# Altium footprint library GCT_USB-C.PcbLib: 27 footprints (part 2 of 2)
Each footprint in its own frame and in the unit in brackets; x right, y up, seen from the top. Pads: shape width x height; smd on the part's side, far side on the other; paste and mask are expansions set on the pad; w line width, h text height; cw(c..) or ccw(c..) is an arc to the next point about the centre after c.
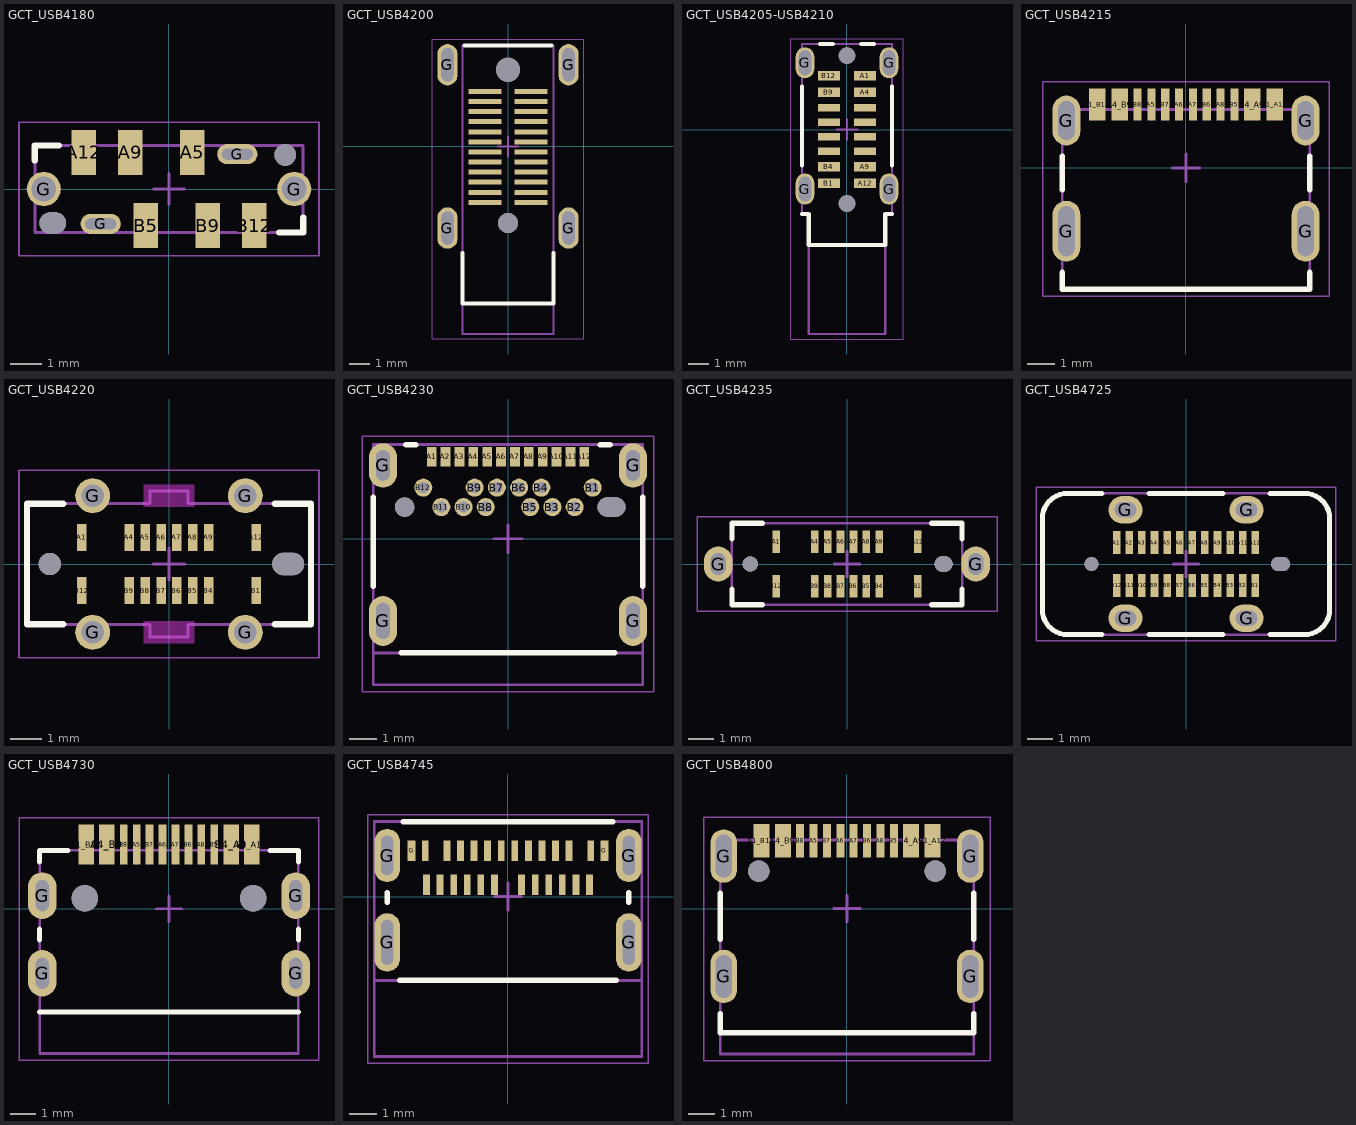
[diagram p1: the footprints below, top view; thin cyan lines are the x and y axes]

## GCT_USB4180 [mm]
height 11.16
pads (12):
  rect 0.8x1.46 smd mask+0.07: A5(0.75,1.18) A9(-1.25,1.18) A12(-2.75,1.18) B5(-0.75,-1.18) B9(1.25,-1.18) B12(2.75,-1.18)
  round 1.1 hole 0.8 mask+0.07: G(-4.04,0) G(4.04,0)
  oval 1.3x0.65 hole 0.35 slot 1 at 0 deg mask+0.07: G(-2.205,-1.125) G(2.205,1.125)
  oval 0.85x0.7 hole 0.7 slot 0.85 at 0 deg unplated mask+0.07: ""(-3.75,-1.1)
  round 0.7 hole 0.7 unplated mask+0.07: ""(3.75,1.1)
Top Overlay:
  lines w0.2: -4.33,0.92 -4.33,1.4 -3.55,1.4 ; 3.55,-1.4 4.33,-1.4 4.33,-0.92
Top Assembly:
  lines w0.1: -4.33,-1.4 4.33,-1.4 4.33,1.4 -4.33,1.4 -4.33,-1.4
  text ".Designator" at -2.252,-0.226 h1
Top Courtyard:
  lines w0.05: -4.84,-2.16 4.84,-2.16 4.84,2.16 -4.84,2.16 -4.84,-2.16
  lines w0.1: -0.5,0 0.5,0 ; 0,-0.5 0,0.5
3D body "usb4180-03-0120-c.stp": height 11.16, standoff -1.14, extent -4.33,-1.7 4.33,1.7

## GCT_USB4200 [mm]
height 10.13
pads (30):
  rect 1.625x0.25 smd mask+0.07: A1(1.138,2.725) A2(1.138,2.225) A3(1.138,1.725) A4(1.138,1.225) A5(1.138,0.725) A6(1.138,0.225) A7(1.138,-0.275) A8(1.138,-0.775) A9(1.138,-1.275) A10(1.138,-1.775) A11(1.138,-2.275) A12(1.138,-2.775) B1(-1.138,-2.775) B2(-1.138,-2.275) B3(-1.138,-1.775) B4(-1.138,-1.275) B5(-1.138,-0.775) B6(-1.138,-0.275) B7(-1.138,0.225) B8(-1.138,0.725) B9(-1.138,1.225) B10(-1.138,1.725) B11(-1.138,2.225) B12(-1.138,2.725)
  oval 1x2.05 hole 0.6 slot 1.65 at 90 deg mask+0.07: G(-3,-4.05) G(-3,4.05) G(3,-4.05) G(3,4.05)
  round 1 hole 1 unplated mask+0.07: ""(0,-3.8)
  round 1.2 hole 1.2 unplated mask+0.07: ""(0,3.8)
Top Overlay:
  lines w0.2: -2.26,-5.293 -2.26,-7.8 2.26,-7.8 2.26,-5.293 ; -2.165,5 2.165,5
Top Assembly:
  lines w0.1: -2.26,-7.8 -2.26,5 2.26,5 2.26,-7.8 -2.26,-7.8
  text ".Designator" at -0.226,2.252 h1
Top Courtyard:
  lines w0.05: -3.75,-9.55 -3.75,5.325 3.75,5.325 3.75,-9.55 -3.75,-9.55
  lines w0.1: -0.5,0 0.5,0 ; 0,-0.5 0,0.5
Assembly Notes:
  lines w0.1: -2.26,-9.3 -2.26,-7.8 2.26,-7.8 2.26,-9.3 -2.26,-9.3
  text "PCB Edge" at -0.034,-7.618 h0.51
3D body "usb4200-03-a.stp": height 9.8, standoff -1.73, extent -3.15,-9.33 3.15,4.97

## GCT_USB4205-USB4210 [mm]
height 12.5
pads (22):
  rect 1.05x0.45 smd mask+0.07: A1(0.875,2.605) A4(0.875,1.805) A9(0.875,-1.795) A12(0.875,-2.595) B1(-0.875,-2.595) B4(-0.875,-1.795) B9(-0.875,1.805) B12(-0.875,2.605)
  rect 1.05x0.35 smd mask+0.07: A5(0.875,1.055) A6(0.875,0.355) A7(0.875,-0.345) A8(0.875,-1.045) B5(-0.875,-1.045) B6(-0.875,-0.345) B7(-0.875,0.355) B8(-0.875,1.055)
  oval 0.9x1.5 hole 0.6 slot 1.2 at 90 deg mask+0.07: G(-2.03,-2.875) G(-2.03,3.225) G(2.03,-2.875) G(2.03,3.225)
  round 0.8 hole 0.8 unplated mask+0.07: ""(0,-3.575) ""(0,3.575)
Top Overlay:
  lines w0.2: -2.18,-4.075 -1.85,-4.075 -1.85,-5.575 1.85,-5.575 1.85,-4.075 2.18,-4.075 ; -2.18,-1.734 -2.18,2.084 ; -1.307,4.125 -0.691,4.125 ; 0.691,4.125 1.307,4.125 ; 2.18,-1.734 2.18,2.084
Top Assembly:
  lines w0.1: -2.18,-4.075 -1.85,-4.075 -1.85,-5.575 1.85,-5.575 1.85,-4.075 2.18,-4.075 2.18,4.125 -2.18,4.125 -2.18,-4.075
  text ".Designator" at -0.226,2.252 h1
Top Courtyard:
  lines w0.05: -2.73,-10.125 2.73,-10.125 2.73,4.375 -2.73,4.375 -2.73,-10.125
  lines w0.1: -0.5,0 0.5,0 ; 0,-0.5 0,0.5
Assembly Notes:
  lines w0.1: -1.85,-9.875 -1.85,-5.575 1.85,-5.575 1.85,-9.875 -1.85,-9.875
  text "PCB Edge" at -0.334,-5.393 h0.51
3D body "usb4205-gf-a.stp": height 12.51, standoff -1.49, extent -2.18,-9.87 2.18,4.14

## GCT_USB4215 [mm]
height 3.16
pads (16):
  rect 0.6x1.15 smd mask+0.07: A1_B12(-3.2,2.288) A4_B9(-2.4,2.288) B1_A12(3.2,2.288) B4_A9(2.4,2.288)
  rect 0.3x1.15 smd mask+0.07: A5(-1.25,2.288) A6(-0.25,2.288) A7(0.25,2.288) A8(1.25,2.288) B5(1.75,2.288) B6(0.75,2.288) B7(-0.75,2.288) B8(-1.75,2.288)
  oval 1x2.2 hole 0.6 slot 1.8 at 90 deg mask+0.07: G(-4.32,-2.287) G(4.32,-2.287)
  oval 1x1.8 hole 0.6 slot 1.4 at 90 deg mask+0.07: G(-4.32,1.713) G(4.32,1.713)
Top Overlay:
  lines w0.2: -4.47,-3.779 -4.47,-4.387 4.47,-4.387 4.47,-3.779 ; -4.47,-0.795 -4.47,0.421 ; 4.47,-0.795 4.47,0.421
Top Assembly:
  lines w0.1: -4.47,-4.387 -4.47,2.113 4.47,2.113 4.47,-4.387 -4.47,-4.387
  text ".Designator" at -2.252,-0.226 h1
  text "PCB Edge" at 2.216,-4.155 h0.51
Top Courtyard:
  lines w0.05: -5.17,-4.637 -5.17,3.113 5.17,3.113 5.17,-4.637 -5.17,-4.637
  lines w0.1: -0.5,0 0.5,0 ; 0,-0.5 0,0.5
3D body "usb4215-03-a.stp": height 3.26, standoff -0.8, extent -4.47,-4.35 4.47,2.399

## GCT_USB4220 [mm]
height 10.4
pads (22):
  rect 0.3x0.85 smd mask+0.07: A1(-2.75,0.835) A4(-1.25,0.835) A5(-0.75,0.835) A6(-0.25,0.835) A7(0.25,0.835) A8(0.75,0.835) A9(1.25,0.835) A12(2.75,0.835) B1(2.75,-0.835) B4(1.25,-0.835) B5(0.75,-0.835) B6(0.25,-0.835) B7(-0.25,-0.835) B8(-0.75,-0.835) B9(-1.25,-0.835) B12(-2.75,-0.835)
  round 1.1 hole 0.7 mask+0.07: G(-2.4,-2.15) G(-2.4,2.15) G(2.4,-2.15) G(2.4,2.15)
  round 0.7 hole 0.7 unplated mask+0.07: ""(-3.75,0)
  oval 1x0.7 hole 0.7 slot 1 at 0 deg unplated mask+0.07: ""(3.75,0)
Top Layer keep-out:
  region: 0.8,1.8 -0.8,1.8 -0.8,2.5 0.8,2.5
  region: 0.8,-2.5 -0.8,-2.5 -0.8,-1.8 0.8,-1.8
Top Overlay:
  lines w0.2: -3.328,-1.9 -4.47,-1.9 -4.47,1.9 -3.328,1.9 ; 3.328,-1.9 4.47,-1.9 4.47,1.9 3.328,1.9
Top Assembly:
  lines w0.1: -4.47,-1.9 -4.47,1.9 -0.6,1.9 -0.6,2.3 0.6,2.3 0.6,1.9 4.47,1.9 4.47,-1.9 0.6,-1.9 0.6,-2.3 -0.6,-2.3 -0.6,-1.9 -4.47,-1.9
  text ".Designator" at -2.252,-0.226 h1
Top Courtyard:
  lines w0.05: -4.72,-2.95 4.72,-2.95 4.72,2.95 -4.72,2.95 -4.72,-2.95
  lines w0.1: -0.5,0 0.5,0 ; 0,-0.5 0,0.5
3D body "usb4220-03-0880-c.stp": height 8.8, standoff -1.1, extent -4.47,-2.3 4.47,2.3

## GCT_USB4230 [mm]
height 3.46
pads (30):
  rect 0.35x0.7 smd mask+0.05: A1(-2.75,2.955) A2(-2.25,2.955) A3(-1.75,2.955) A4(-1.25,2.955) A5(-0.75,2.955) A6(-0.25,2.955) A7(0.25,2.955) A8(0.75,2.955) A9(1.25,2.955) A10(1.75,2.955) A11(2.25,2.955) A12(2.75,2.955)
  round 0.65 hole 0.4 mask+0.05: B1(3.05,1.845) B2(2.4,1.145) B3(1.6,1.145) B4(1.2,1.845) B5(0.8,1.145) B6(0.4,1.845) B7(-0.4,1.845) B8(-0.8,1.145) B9(-1.2,1.845) B10(-1.6,1.145) B11(-2.4,1.145) B12(-3.05,1.845)
  oval 1x1.8 hole 0.5 slot 1.3 at 90 deg mask+0.05: G(-4.5,-2.955) G(4.5,-2.955)
  oval 1x1.6 hole 0.5 slot 1.1 at 90 deg mask+0.05: G(-4.5,2.645) G(4.5,2.645)
  round 0.7 hole 0.7 unplated mask+0.05: ""(-3.725,1.145)
  oval 1x0.7 hole 0.7 slot 1 at 0 deg unplated mask+0.05: ""(3.725,1.145)
Top Overlay:
  lines w0.2: -4.85,-1.7 -4.85,1.49 ; -3.84,-4.105 3.84,-4.105 ; -3.673,3.395 -3.323,3.395 ; 3.323,3.395 3.673,3.395 ; 4.85,-1.7 4.85,1.49
Top Assembly:
  lines w0.1: -4.85,-4.105 -4.85,3.395 4.85,3.395 4.85,-4.105 -4.85,-4.105
  text ".Designator" at -2.252,-0.226 h1
Top Courtyard:
  lines w0.05: -5.25,-5.505 -5.25,3.695 5.25,3.695 5.25,-5.505 -5.25,-5.505
  lines w0.1: -0.5,0 0.5,0 ; 0,-0.5 0,0.5
Assembly Notes:
  lines w0.1: 4.836,-4.105 -4.85,-4.105 -4.85,-5.255 4.85,-5.255 ; 4.851,-5.254 4.851,-4.089
  text "PCB Edge" at 1.766,-3.948 h0.51
3D body "usb4230-03-a.stp": height 3.46, standoff -1.6, extent -4.88,-5.25 4.88,3.4

## GCT_USB4235 [mm]
height 6.5
pads (20):
  rect 0.3x0.87 smd mask+0.07: A1(-2.75,0.865) A4(-1.25,0.865) A5(-0.75,0.865) A6(-0.25,0.865) A7(0.25,0.865) A8(0.75,0.865) A9(1.25,0.865) A12(2.75,0.865) B1(2.75,-0.865) B4(1.25,-0.865) B5(0.75,-0.865) B6(0.25,-0.865) B7(-0.25,-0.865) B8(-0.75,-0.865) B9(-1.25,-0.865) B12(-2.75,-0.865)
  oval 1.1x1.35 hole 0.6 slot 0.85 at 90 deg mask+0.07: G(-5,0) G(5,0)
  round 0.6 hole 0.6 unplated mask+0.07: ""(-3.75,0)
  oval 0.7x0.6 hole 0.6 slot 0.7 at 0 deg unplated mask+0.07: ""(3.75,0)
Top Overlay:
  lines w0.2: -4.47,-0.977 -4.47,-1.58 -3.281,-1.58 ; -4.47,0.977 -4.47,1.58 -3.281,1.58 ; 3.281,-1.58 4.47,-1.58 4.47,-0.977 ; 3.281,1.58 4.47,1.58 4.47,0.977
Top Assembly:
  lines w0.1: -4.47,-1.58 -4.47,1.58 4.47,1.58 4.47,-1.58 -4.47,-1.58
  text ".Designator" at -2.252,-0.226 h1
Top Courtyard:
  lines w0.05: -5.825,-1.83 -5.825,1.83 5.825,1.83 5.825,-1.83 -5.825,-1.83
  lines w0.1: -0.5,0 0.5,0 ; 0,-0.5 0,0.5
3D body "usb4235-03-c.stp": height 6.5, standoff -0.95, extent -5.15,-1.6 5.15,1.6

## GCT_USB4725 [mm]
height 6.7
pads (30):
  rect 0.3x0.9 smd mask+0.07: A1(-2.75,0.85) A2(-2.25,0.85) A3(-1.75,0.85) A4(-1.25,0.85) A5(-0.75,0.85) A6(-0.25,0.85) A7(0.25,0.85) A8(0.75,0.85) A9(1.25,0.85) A10(1.75,0.85) A11(2.25,0.85) A12(2.75,0.85) B1(2.75,-0.85) B2(2.25,-0.85) B3(1.75,-0.85) B4(1.25,-0.85) B5(0.75,-0.85) B6(0.25,-0.85) B7(-0.25,-0.85) B8(-0.75,-0.85) B9(-1.25,-0.85) B10(-1.75,-0.85) B11(-2.25,-0.85) B12(-2.75,-0.85)
  oval 1.35x1.1 hole 0.6 slot 0.85 at 0 deg mask+0.07: G(-2.4,-2.15) G(-2.4,2.15) G(2.4,-2.15) G(2.4,2.15)
  round 0.55 hole 0.55 unplated mask+0.07: ""(-3.75,0)
  oval 0.75x0.55 hole 0.55 slot 0.75 at 0 deg unplated mask+0.07: ""(3.75,0)
Top Overlay:
  lines w0.2: -3.331,-2.8 -4.7,-2.8 cw(c-4.7,-1.8) -5.7,-1.8 -5.7,1.8 cw(c-4.7,1.8) -4.7,2.8 -3.331,2.8 ; -1.469,-2.8 1.469,-2.8 ; -1.469,2.8 1.469,2.8 ; 3.331,-2.8 4.7,-2.8 ccw(c4.7,-1.8) 5.7,-1.8 5.7,1.8 ccw(c4.7,1.8) 4.7,2.8 3.331,2.8
Top Assembly:
  lines w0.1: -5.7,-1.8 ccw(c-4.7,-1.8) -4.7,-2.8 ; -5.7,-1.8 ccw(c-4.7,-1.8) -4.7,-2.8 ; -5.7,-1.8 -5.7,1.8 ; -5.7,1.8 cw(c-4.7,1.8) -4.7,2.8 ; -5.7,1.8 cw(c-4.7,1.8) -4.7,2.8 ; -4.7,-2.8 4.7,-2.8 ; -4.7,2.8 4.7,2.8 ; 4.7,-2.8 ccw(c4.7,-1.8) 5.7,-1.8 ; 4.7,-2.8 ccw(c4.7,-1.8) 5.7,-1.8 ; 4.7,2.8 cw(c4.7,1.8) 5.7,1.8 ; 4.7,2.8 cw(c4.7,1.8) 5.7,1.8 ; 5.7,-1.8 5.7,1.8
  text ".Designator" at -2.252,-0.226 h1
Top Courtyard:
  lines w0.05: -5.95,-3.05 -5.95,3.05 5.95,3.05 5.95,-3.05 -5.95,-3.05
  lines w0.1: -0.5,0 0.5,0 ; 0,-0.5 0,0.5
3D body "usb4725-03-c.stp": height 6.55, standoff -0.85, extent -5.7,-2.8 5.7,2.8

## GCT_USB4730 [mm]
height 4.66
pads (18):
  rect 0.6x1.55 smd mask+0.05: A1_B12(-3.2,2.488) A4_B9(-2.4,2.488) B1_A12(3.2,2.488) B4_A9(2.4,2.488)
  rect 0.3x1.55 smd mask+0.05: A5(-1.25,2.488) A6(-0.25,2.488) A7(0.25,2.488) A8(1.25,2.488) B5(1.75,2.488) B6(0.75,2.488) B7(-0.75,2.488) B8(-1.75,2.488)
  rrect100% 1.1x1.8 hole 0.5 slot 1.2 at 90 deg mask+0.07: G(-4.895,-2.487) G(4.895,-2.487)
  oval 1.1x1.8 hole 0.5 slot 1.2 at 90 deg mask+0.07: G(-4.895,0.513) G(4.895,0.513)
  round 1.02 hole 1.02 unplated mask+0.07: ""(-3.25,0.413) ""(3.25,0.413)
Top Overlay:
  lines w0.2: -5,-3.987 5,-3.987 ; -5,-1.191 -5,-0.783 ; -5,1.809 -5,2.263 -3.9,2.263 ; 3.9,2.263 5,2.263 5,1.809 ; 5,-1.191 5,-0.783
Top Assembly:
  lines w0.1: -5,-3.987 5,-3.987 ; -5,-3.987 -5,2.263 5,2.263 5,-3.987
  text ".Designator" at -2.252,-0.226 h1
Top Courtyard:
  lines w0.05: -5.795,-5.837 -5.795,3.513 5.795,3.513 5.795,-5.837 -5.795,-5.837
  lines w0.1: -0.5,0 0.5,0 ; 0,-0.5 0,0.5
Assembly Notes:
  lines w0.1: -5,-3.987 -5,-5.587 5,-5.587 5,-3.987 -4.999,-3.987
  text "PCB Edge" at 2.766,-3.805 h0.51
3D body "step_temp.STEP": height 4.66, standoff -0.65, extent -5.03,-5.6 4.97,2.755

## GCT_USB4745 [mm]
height 4.21
pads (30):
  rect 0.25x0.75 smd mask+0.07: A1(-3.05,1.687) A2(-2.25,1.687) A3(-1.75,1.687) A4(-1.25,1.687) A5(-0.75,1.687) A6(-0.25,1.687) A7(0.25,1.687) A8(0.75,1.687) A9(1.25,1.687) A10(1.75,1.687) A11(2.25,1.687) A12(3.05,1.687) B1(3,0.437) B2(2.5,0.437) B3(2,0.437) B4(1.5,0.437) B5(1,0.437) B6(0.5,0.437) B7(-0.5,0.437) B8(-1,0.437) B9(-1.5,0.437) B10(-2,0.437) B11(-2.5,0.437) B12(-3,0.437)
  oval 0.95x2.15 hole 0.45 slot 1.65 at 90 deg mask+0.07: G(-4.45,-1.687) G(4.45,-1.687)
  oval 0.95x1.95 hole 0.45 slot 1.45 at 90 deg mask+0.07: G(-4.45,1.513) G(4.45,1.513)
  rect 0.3x0.75 smd mask+0.07: G(-3.55,1.687) G(3.55,1.687)
Top Overlay:
  lines w0.2: -4.45,-0.212 -4.45,0.138 ; -3.995,-3.087 3.995,-3.087 ; -3.853,2.763 3.853,2.763 ; 4.45,-0.212 4.45,0.138
Top Assembly:
  lines w0.1: -4.925,-3.087 -4.925,2.763 4.925,2.763 4.925,-3.087 -4.925,-3.087
  text ".Designator" at -2.252,-0.226 h1
Top Courtyard:
  lines w0.05: -5.175,-6.138 -5.175,3.013 5.175,3.013 5.175,-6.138 -5.175,-6.138
  lines w0.1: -0.5,0 0.5,0 ; 0,-0.5 0,0.5
Assembly Notes:
  lines w0.1: -4.925,-5.887 -4.925,-3.087 4.925,-3.087 4.925,-5.887 -4.925,-5.887
  text "PCB Edge" at 1.866,-2.905 h0.51
3D body "usb4745-03-a.stp": height 3.53, standoff -0.53, extent -4.925,-5.87 4.925,2.78

## GCT_USB4800 [mm]
height 5.38
pads (18):
  rect 0.6x1.25 smd mask+0.05: A1_B12(-3.2,2.538) A4_B9(-2.4,2.538) B1_A12(3.2,2.538) B4_A9(2.4,2.538)
  rect 0.3x1.25 smd mask+0.05: A5(-1.25,2.538) A6(-0.25,2.538) A7(0.25,2.538) A8(1.25,2.538) B5(1.75,2.538) B6(0.75,2.538) B7(-0.75,2.538) B8(-1.75,2.538)
  oval 1x2 hole 0.6 slot 1.6 at 90 deg mask+0.07: G(-4.61,-2.537) G(-4.61,1.963) G(4.61,-2.537) G(4.61,1.963)
  round 0.8 hole 0.8 unplated mask+0.05: ""(-3.3,1.403) ""(3.3,1.403)
Top Overlay:
  lines w0.2: -4.735,-3.931 -4.735,-4.637 4.735,-4.637 4.735,-3.931 ; -4.735,-1.143 -4.735,0.569 ; 4.735,-1.143 4.735,0.569
Top Assembly:
  lines w0.1: -4.735,-4.637 4.735,-4.637 ; -4.735,-4.637 -4.735,2.563 4.735,2.563 4.735,-4.637
  text ".Designator" at -2.252,-0.226 h1
Top Courtyard:
  lines w0.05: -5.36,-5.687 5.36,-5.687 5.36,3.413 -5.36,3.413 -5.36,-5.687
  lines w0.1: -0.5,0 0.5,0 ; 0,-0.5 0,0.5
Assembly Notes:
  lines w0.1: 4.735,-4.637 -4.735,-4.637 -4.735,-5.437 4.735,-5.437 4.735,-4.637
  text "PCB Edge" at 2.466,-4.405 h0.51
3D body "step_temp.STEP": height 5.38, standoff -1.3, extent -4.735,-5.437 4.735,2.963